# Altium footprint library Diodes.PcbLib: 67 footprints (part 5 of 5)
Each footprint in its own frame and in the unit in brackets; x right, y up, seen from the top. Pads: shape width x height; smd on the part's side, far side on the other; paste and mask are expansions set on the pad; w line width, h text height; cw(c..) or ccw(c..) is an arc to the next point about the centre after c.
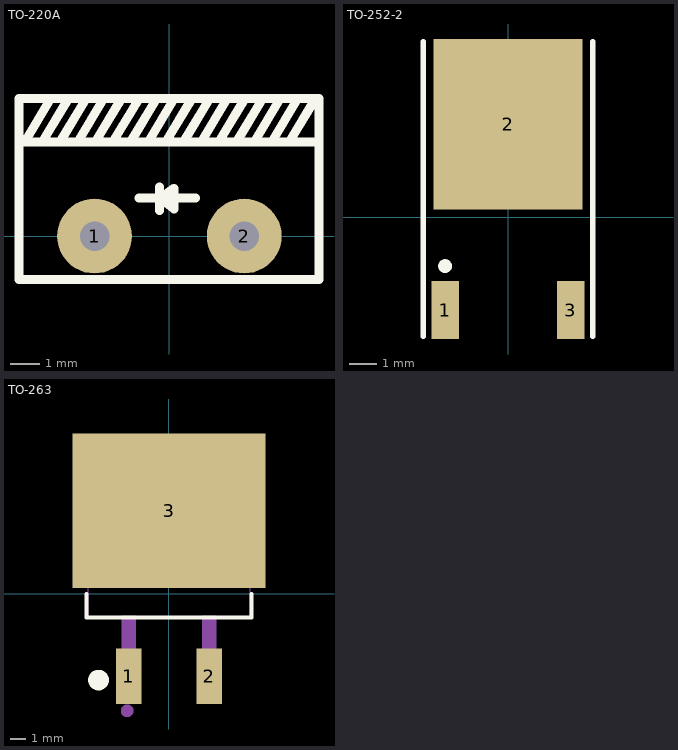
[diagram p4: the footprints below, top view; thin cyan lines are the x and y axes]

## TO-220A [mm]
pads (2):
  round 2.54 hole 1: 1(-2.54,0) 2(2.54,0)
Top Overlay:
  lines w0.3: -4.913,3.2 -4.024,4.674 ; -4.314,3.2 -3.425,4.674 ; -3.714,3.2 -2.825,4.674 ; -3.115,3.2 -2.226,4.674 ; -2.516,3.2 -1.627,4.674 ; -1.917,3.2 -1.028,4.674 ; -1.318,3.2 -0.429,4.674 ; -1.041,1.295 -0.305,1.295 ; -0.719,3.2 0.17,4.674 ; -0.33,1.676 -0.33,0.864 -0.305,1.295 ; -0.12,3.2 0.769,4.674 ; 0.48,3.2 1.369,4.674 ; 0.889,1.295 0.152,1.295 ; 1.079,3.2 1.968,4.674 ; 1.678,3.2 2.567,4.674 ; 2.277,3.2 3.166,4.674 ; 2.876,3.2 3.765,4.674 ; 3.475,3.2 4.364,4.674 ; 4.074,3.2 4.963,4.674 ; -5.105,3.2 -5.105,4.674 5.08,4.674 5.08,3.2 ; -5.105,3.2 5.08,3.2 ; -5.105,3.2 -5.105,-1.473 5.08,-1.473 5.08,3.2 ; -0.305,1.295 0.152,1.626 0.152,0.914 ; -0.305,1.295 0.152,0.914 ; -0.305,1.295 0.152,1.295 ; 0.152,0.914 0.152,1.295
3D body "CircuitWorks-TO-220HS.STEP": height 18.54, standoff -3.81, extent -5.08,-1.397 5.08,3.175

## TO-252-2 [mm]
pads (3):
  rect 1x2.1 smd: 1(-2.285,-3.375) 3(2.285,-3.375)
  rect 5.4x6.2 smd: 2(0,3.375)
Top Overlay:
  circle w0.25: c-2.285,-1.775 r0.125
  lines w0.2: -3.085,-4.325 -3.085,6.375 ; 3.085,-4.325 3.085,6.375
3D body "User Library-DPAK-1.step": height 2.39, standoff -0.02, extent -3.27,-4.111 3.27,5.828

## TO-263 [mil] "D2PAK_L10.2-W9.0-P5.08-LS16.9-BR"
pads (3):
  rect 63x137.8 smd paste+0 mask+1.97: 1(-100,-205.58) 2(100,-205.58)
  rect 480.3x383.9 smd paste+0 mask+1.97: 3(0,205.58)
Top Overlay:
  circle w27.56: c-175,-215 r11.81
  lines w10: -205,-1.58 -205,-59.58 205,-59.58 205,-1.58
Mechanical 6:
  circle w15.75: c-103.94,-291.34 r7.87
Mechanical 15:
  region: -175.03,-218.6 -173.42,-218.57 -171.17,-216.27 -171.17,-213.06 -173.42,-210.76 -175.03,-210.73 -176.64,-210.76 -178.89,-213.06 -178.89,-216.27 -176.64,-218.57
  region: 82.68,-55.12 117.68,-55.12 117.68,-110.12 117.68,-167.72 100.79,-167.72 82.68,-167.72
  region: 115.75,-262.99 84.25,-262.99 84.25,-162.99 115.75,-162.99
  region: -84.25,-263.78 -115.75,-263.78 -115.75,-163.78 -84.25,-163.78
  region: -117.32,-55.12 -82.32,-55.12 -82.32,-110.12 -82.32,-167.72 -99.21,-167.72 -117.32,-167.72
  region: -192.13,337.01 192.11,337.01 192.11,29.89 -192.13,29.89
  lines w2: -200,-57.01 -200,380 201.58,380 201.57,-57.01 -200,-57.01